# Altium footprint library HSD_connectors.PcbLib: 59 footprints (part 4 of 7)
Each footprint in its own frame and in the unit in brackets; x right, y up, seen from the top. Pads: shape width x height; smd on the part's side, far side on the other; paste and mask are expansions set on the pad; w line width, h text height; cw(c..) or ccw(c..) is an arc to the next point about the centre after c.
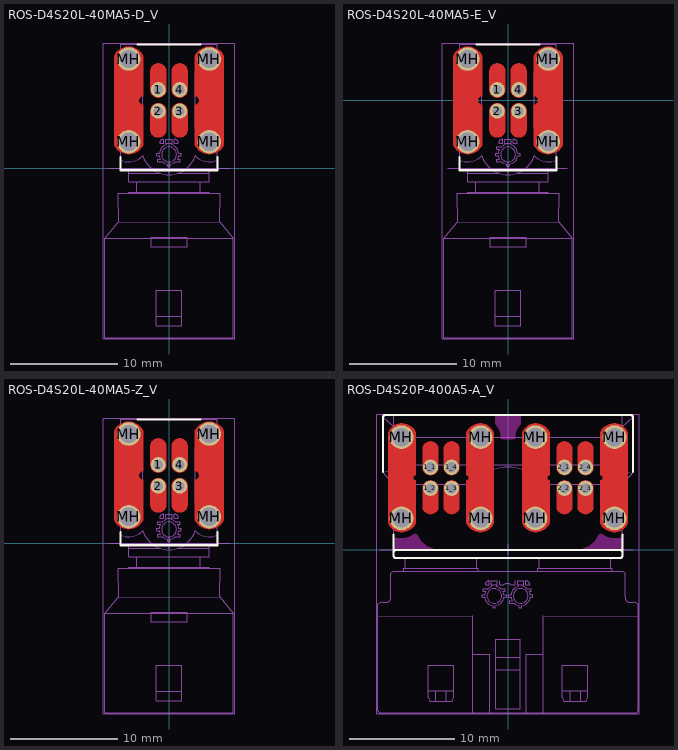
[diagram p3: the footprints below, top view; thin cyan lines are the x and y axes]

## ROS-D4S20L-40MA5-D_V [mm] "HSD Right Angle Plug, Edge Mount Pin in Paste, 27.3x12x6.95mm, Rosenberger Recommended"
height 6.95
pads (8):
  round 1.4 hole 0.9: 1(-1,7.307) 2(-1,5.307) 3(1,5.307) 4(1,7.307)
  round 2.2 hole 1.7: MH(-3.75,2.457) MH(-3.75,10.157) MH(3.75,2.457) MH(3.75,10.157)
Top Layer:
  region: 5.1,6.307 3.75,6.307 3.75,9.307 3.861,9.314 4.075,9.372 4.267,9.483 4.424,9.64 4.535,9.832 4.593,10.046 4.593,10.268 4.535,10.482 4.424,10.674 4.267,10.831 4.075,10.942 3.861,11 3.75,11.007 3.75,11.307 3.855,11.307 4.064,11.278 4.267,11.219 4.459,11.133 4.637,11.021 4.798,10.885 4.939,10.728 5.056,10.553 5.102,10.458 5.1,10.458
  region: 3.75,11.307 3.645,11.307 3.436,11.278 3.233,11.219 3.041,11.133 2.863,11.021 2.702,10.885 2.561,10.728 2.444,10.553 2.398,10.458 2.4,10.458 2.4,6.707 2.478,6.699 2.622,6.64 2.733,6.529 2.792,6.385 2.8,6.307 3.75,6.307 3.75,9.307 3.639,9.314 3.425,9.372 3.233,9.483 3.076,9.64 2.965,9.832 2.907,10.046 2.907,10.268 2.965,10.482 3.076,10.674 3.233,10.831 3.425,10.942 3.639,11 3.75,11.007
  region: -5.1,6.307 -3.75,6.307 -3.75,9.307 -3.861,9.314 -4.075,9.372 -4.267,9.483 -4.424,9.64 -4.535,9.832 -4.593,10.046 -4.593,10.268 -4.535,10.482 -4.424,10.674 -4.267,10.831 -4.075,10.942 -3.861,11 -3.75,11.007 -3.75,11.307 -3.855,11.307 -4.064,11.278 -4.267,11.219 -4.459,11.133 -4.637,11.021 -4.798,10.885 -4.939,10.728 -5.056,10.553 -5.102,10.458 -5.1,10.458
  region: -3.75,11.307 -3.645,11.307 -3.436,11.278 -3.233,11.219 -3.041,11.133 -2.863,11.021 -2.702,10.885 -2.561,10.728 -2.444,10.553 -2.398,10.458 -2.4,10.458 -2.4,6.707 -2.478,6.699 -2.622,6.64 -2.733,6.529 -2.792,6.385 -2.8,6.307 -3.75,6.307 -3.75,9.307 -3.639,9.314 -3.425,9.372 -3.233,9.483 -3.076,9.64 -2.965,9.832 -2.907,10.046 -2.907,10.268 -2.965,10.482 -3.076,10.674 -3.233,10.831 -3.425,10.942 -3.639,11 -3.75,11.007
  region: -5.1,6.307 -3.75,6.307 -3.75,3.307 -3.861,3.3 -4.075,3.242 -4.267,3.131 -4.424,2.974 -4.535,2.782 -4.593,2.568 -4.593,2.346 -4.535,2.132 -4.424,1.94 -4.267,1.783 -4.075,1.672 -3.861,1.614 -3.75,1.607 -3.75,1.307 -3.855,1.307 -4.064,1.336 -4.267,1.395 -4.459,1.481 -4.637,1.593 -4.798,1.729 -4.939,1.886 -5.056,2.061 -5.102,2.156 -5.1,2.156
  region: -3.75,1.307 -3.645,1.307 -3.436,1.336 -3.233,1.395 -3.041,1.481 -2.863,1.593 -2.702,1.729 -2.561,1.886 -2.444,2.061 -2.398,2.156 -2.4,2.156 -2.4,5.907 -2.478,5.915 -2.622,5.974 -2.733,6.085 -2.792,6.229 -2.8,6.307 -3.75,6.307 -3.75,3.307 -3.639,3.3 -3.425,3.242 -3.233,3.131 -3.076,2.974 -2.965,2.782 -2.907,2.568 -2.907,2.346 -2.965,2.132 -3.076,1.94 -3.233,1.783 -3.425,1.672 -3.639,1.614 -3.75,1.607
  region: 3.75,1.307 3.645,1.307 3.436,1.336 3.233,1.395 3.041,1.481 2.863,1.593 2.702,1.729 2.561,1.886 2.444,2.061 2.398,2.156 2.4,2.156 2.4,5.907 2.478,5.915 2.622,5.974 2.733,6.085 2.792,6.229 2.8,6.307 3.75,6.307 3.75,3.307 3.639,3.3 3.425,3.242 3.233,3.131 3.076,2.974 2.965,2.782 2.907,2.568 2.907,2.346 2.965,2.132 3.076,1.94 3.233,1.783 3.425,1.672 3.639,1.614 3.75,1.607
  region: 5.1,6.307 3.75,6.307 3.75,3.307 3.861,3.3 4.075,3.242 4.267,3.131 4.424,2.974 4.535,2.782 4.593,2.568 4.593,2.346 4.535,2.132 4.424,1.94 4.267,1.783 4.075,1.672 3.861,1.614 3.75,1.607 3.75,1.307 3.855,1.307 4.064,1.336 4.267,1.395 4.459,1.481 4.637,1.593 4.798,1.729 4.939,1.886 5.056,2.061 5.102,2.156 5.1,2.156
  region: -1.75,9.007 -1.75,9.081 -1.721,9.226 -1.665,9.362 -1.583,9.485 -1.478,9.59 -1.355,9.672 -1.219,9.728 -1.074,9.757 -1,9.757 -1,7.757 -1.088,7.748 -1.25,7.681 -1.374,7.557 -1.441,7.395 -1.441,7.219 -1.374,7.057 -1.25,6.933 -1.088,6.866 -1,6.857 -1,6.557 -1.074,6.557 -1.219,6.586 -1.355,6.642 -1.478,6.724 -1.583,6.829 -1.665,6.952 -1.721,7.088 -1.75,7.233 -1.75,7.307
  region: -0.25,9.007 -0.25,9.081 -0.279,9.226 -0.335,9.362 -0.417,9.485 -0.522,9.59 -0.645,9.672 -0.781,9.728 -0.926,9.757 -1,9.757 -1,7.757 -0.912,7.748 -0.75,7.681 -0.626,7.557 -0.559,7.395 -0.559,7.219 -0.626,7.057 -0.75,6.933 -0.912,6.866 -1,6.857 -1,6.557 -0.926,6.557 -0.781,6.586 -0.645,6.642 -0.522,6.724 -0.417,6.829 -0.335,6.952 -0.279,7.088 -0.25,7.233 -0.25,7.307
  region: -1.75,3.607 -1.75,3.533 -1.721,3.388 -1.665,3.252 -1.583,3.129 -1.478,3.024 -1.355,2.942 -1.219,2.886 -1.074,2.857 -1,2.857 -1,4.857 -1.088,4.866 -1.25,4.933 -1.374,5.057 -1.441,5.219 -1.441,5.395 -1.374,5.557 -1.25,5.681 -1.088,5.748 -1,5.757 -1,6.057 -1.074,6.057 -1.219,6.028 -1.355,5.972 -1.478,5.89 -1.583,5.785 -1.665,5.662 -1.721,5.526 -1.75,5.381 -1.75,5.307
  region: -0.25,3.607 -0.25,3.533 -0.279,3.388 -0.335,3.252 -0.417,3.129 -0.522,3.024 -0.645,2.942 -0.781,2.886 -0.926,2.857 -1,2.857 -1,4.857 -0.912,4.866 -0.75,4.933 -0.626,5.057 -0.559,5.219 -0.559,5.395 -0.626,5.557 -0.75,5.681 -0.912,5.748 -1,5.757 -1,6.057 -0.926,6.057 -0.781,6.028 -0.645,5.972 -0.522,5.89 -0.417,5.785 -0.335,5.662 -0.279,5.526 -0.25,5.381 -0.25,5.307
  region: 1.75,3.607 1.75,3.533 1.721,3.388 1.665,3.252 1.583,3.129 1.478,3.024 1.355,2.942 1.219,2.886 1.074,2.857 1,2.857 1,4.857 1.088,4.866 1.25,4.933 1.374,5.057 1.441,5.219 1.441,5.395 1.374,5.557 1.25,5.681 1.088,5.748 1,5.757 1,6.057 1.074,6.057 1.219,6.028 1.355,5.972 1.478,5.89 1.583,5.785 1.665,5.662 1.721,5.526 1.75,5.381 1.75,5.307
  region: 0.25,3.607 0.25,3.533 0.279,3.388 0.335,3.252 0.417,3.129 0.522,3.024 0.645,2.942 0.781,2.886 0.926,2.857 1,2.857 1,4.857 0.912,4.866 0.75,4.933 0.626,5.057 0.559,5.219 0.559,5.395 0.626,5.557 0.75,5.681 0.912,5.748 1,5.757 1,6.057 0.926,6.057 0.781,6.028 0.645,5.972 0.522,5.89 0.417,5.785 0.335,5.662 0.279,5.526 0.25,5.381 0.25,5.307
  region: 0.25,9.007 0.25,9.081 0.279,9.226 0.335,9.362 0.417,9.485 0.522,9.59 0.645,9.672 0.781,9.728 0.926,9.757 1,9.757 1,7.757 0.912,7.748 0.75,7.681 0.626,7.557 0.559,7.395 0.559,7.219 0.626,7.057 0.75,6.933 0.912,6.866 1,6.857 1,6.557 0.926,6.557 0.781,6.586 0.645,6.642 0.522,6.724 0.417,6.829 0.335,6.952 0.279,7.088 0.25,7.233 0.25,7.307
  region: 1.75,9.007 1.75,9.081 1.721,9.226 1.665,9.362 1.583,9.485 1.478,9.59 1.355,9.672 1.219,9.728 1.074,9.757 1,9.757 1,7.757 1.088,7.748 1.25,7.681 1.374,7.557 1.441,7.395 1.441,7.219 1.374,7.057 1.25,6.933 1.088,6.866 1,6.857 1,6.557 1.074,6.557 1.219,6.586 1.355,6.642 1.478,6.724 1.583,6.829 1.665,6.952 1.721,7.088 1.75,7.233 1.75,7.307
Top Overlay:
  lines w0.2: -4.5,1.054 -4.5,-0.191 ; -2.903,11.509 2.903,11.509 ; 4.5,1.054 4.5,-0.191 3.725,-0.191 -3.725,-0.191 -4.5,-0.191 ; -4.5,-0.191 -4.5,-0.191
Top Paste:
  drawing of 8 lines, arcs and shapes, not listed
Top Solder:
  drawing of 8 lines, arcs and shapes, not listed
Mechanical 3:
  lines w0.1: -5.6,0 5.7,0
  text "Board Edge" at -5.6,-0.6 h0.2
Mechanical 13:
  circle w0.1: c3.75,2.457 r0.675
  circle w0.1: c-3.75,2.457 r0.675
  circle w0.1: c-3.75,10.157 r0.675
  circle w0.1: c3.75,10.157 r0.675
  circle w0.1: c1,5.307 r0.34
  circle w0.1: c1,7.307 r0.34
  circle w0.1: c-1,7.307 r0.34
  circle w0.1: c-1,5.307 r0.34
  circle w0.1: c0,1.282 r0.7
  lines w0.1: -4.493,0.748 ccw(c-3.75,2.457) -2.42,1.152 ; -4.493,4.166 cw(c-3.75,2.457) -2.42,3.762 -2.42,8.852 cw(c-3.75,10.157) -4.493,8.448 ; -3.725,-2.341 -3.725,-2.241 3.725,-2.241 3.725,-2.341 ; -3.725,-0.491 -0.785,-0.491 ; -3,-2.241 -3,-1.241 ; -2.425,1.151 ccw(c0,1.932) 2.425,1.151 ; -1.7,-7.291 1.7,-7.291 1.7,-6.441 -1.7,-6.441 -1.693,-7.291 ; -1.2,-13.791 1.2,-13.791 ; -0.915,1.169 -1.121,1.169 -1.121,1.395 -0.915,1.395 cw(c0,1.282) -0.251,2.169 ; -0.915,1.169 ccw(c0,1.282) -0.798,0.819 ; -0.798,0.818 -1.025,0.818 -1.025,0.582 -0.6,0.582 ; -0.6,0.582 ccw(c0,1.282) -0.113,0.367 -0.113,0.161 0.113,0.161 0.113,0.367 ccw(c0,1.282) 0.6,0.582 ; -0.215,2.332 0.285,2.332 ; 0.25,2.166 0.25,2.332 -0.25,2.332 ; 0.251,2.169 cw(c0,1.282) 0.915,1.395 1.121,1.395 1.121,1.169 0.915,1.169 ; 0.6,0.582 1.025,0.582 1.025,0.818 0.798,0.818 ; 0.785,-0.491 3.725,-0.491 ; 0.798,0.819 ccw(c0,1.282) 0.915,1.169 ; 2.42,1.152 ccw(c3.75,2.457) 4.493,0.748 ; 2.898,-2.241 2.898,-1.241 ; 4.493,4.166 ccw(c3.75,2.457) 2.42,3.762 2.42,8.852 ccw(c3.75,10.157) 4.493,8.448 ; 4.747,-4.996 -4.717,-5.011 ; 5.842,-15.791 5.969,-15.791 ; 5.983,-6.518 4.742,-4.99 4.75,-2.341 -4.75,-2.341 -4.717,-5.011 ; -5.983,-6.518 -4.717,-5.011 ; -5.983,-6.518 -6,-15.791 6,-15.791 6,-6.518 -5.983,-6.518 ; -3.725,-0.191 -4.5,-0.191 -4.5,11.509 4.5,11.509 4.5,-0.191 3.725,-0.191 ; -3.725,-0.191 -3.725,-1.241 -3,-1.241 ; -3.725,-0.191 3.725,-0.191 ; -3,-1.241 2.898,-1.241 ; -0.25,2.332 -0.25,2.166 -0.25,2.332 ; 0.285,2.332 0.285,2.707 -0.285,2.707 -0.285,2.332 0.285,2.332 ; 2.898,-1.241 3.725,-1.241 3.725,-0.191 ; -1.2,-14.655 1.2,-14.638 1.2,-11.341 -1.2,-11.341 -1.2,-14.655 ; -0.875,2.332 cw(c-0.5,2.332) -0.5,2.707 -0.5,2.332 -0.875,2.332 ; 0.5,2.332 0.5,2.707 cw(c0.5,2.332) 0.875,2.332 0.5,2.332
  text ".Designator" at -3.798,-4.402 h2.69
Mechanical 15:
  lines w0.05: -6.1,-15.891 6.1,-15.892 6.1,11.609 -6.1,11.609 -6.1,-15.891
  lines w0.1: -0.5,0 0.5,0 ; 0,-0.5 0,0.5
3D body "d4s20l-40mA5-D.stp": height 10.95, standoff -3.2, extent -6,-15.791 6,11.509

## ROS-D4S20L-40MA5-E_V [mm] "HSD Right Angle Plug, Edge Mount Pin in Paste, 27.3x12x6.95mm, Rosenberger Recommended"
height 6.95
pads (8):
  round 1.4 hole 0.9: 1(-1,1) 2(-1,-1) 3(1,-1) 4(1,1)
  round 2.2 hole 1.7: MH(-3.75,-3.85) MH(-3.75,3.85) MH(3.75,-3.85) MH(3.75,3.85)
Top Layer:
  region: 1.75,2.7 1.75,2.774 1.721,2.919 1.665,3.055 1.583,3.178 1.478,3.283 1.355,3.365 1.219,3.421 1.074,3.45 1,3.45 1,1.45 1.088,1.441 1.25,1.374 1.374,1.25 1.441,1.088 1.441,0.912 1.374,0.75 1.25,0.626 1.088,0.559 1,0.55 1,0.25 1.074,0.25 1.219,0.279 1.355,0.335 1.478,0.417 1.583,0.522 1.665,0.645 1.721,0.781 1.75,0.926 1.75,1
  region: 0.25,2.7 0.25,2.774 0.279,2.919 0.335,3.055 0.417,3.178 0.522,3.283 0.645,3.365 0.781,3.421 0.926,3.45 1,3.45 1,1.45 0.912,1.441 0.75,1.374 0.626,1.25 0.559,1.088 0.559,0.912 0.626,0.75 0.75,0.626 0.912,0.559 1,0.55 1,0.25 0.926,0.25 0.781,0.279 0.645,0.335 0.522,0.417 0.417,0.522 0.335,0.645 0.279,0.781 0.25,0.926 0.25,1
  region: 0.25,-2.7 0.25,-2.774 0.279,-2.919 0.335,-3.055 0.417,-3.178 0.522,-3.283 0.645,-3.365 0.781,-3.421 0.926,-3.45 1,-3.45 1,-1.45 0.912,-1.441 0.75,-1.374 0.626,-1.25 0.559,-1.088 0.559,-0.912 0.626,-0.75 0.75,-0.626 0.912,-0.559 1,-0.55 1,-0.25 0.926,-0.25 0.781,-0.279 0.645,-0.335 0.522,-0.417 0.417,-0.522 0.335,-0.645 0.279,-0.781 0.25,-0.926 0.25,-1
  region: 1.75,-2.7 1.75,-2.774 1.721,-2.919 1.665,-3.055 1.583,-3.178 1.478,-3.283 1.355,-3.365 1.219,-3.421 1.074,-3.45 1,-3.45 1,-1.45 1.088,-1.441 1.25,-1.374 1.374,-1.25 1.441,-1.088 1.441,-0.912 1.374,-0.75 1.25,-0.626 1.088,-0.559 1,-0.55 1,-0.25 1.074,-0.25 1.219,-0.279 1.355,-0.335 1.478,-0.417 1.583,-0.522 1.665,-0.645 1.721,-0.781 1.75,-0.926 1.75,-1
  region: -0.25,-2.7 -0.25,-2.774 -0.279,-2.919 -0.335,-3.055 -0.417,-3.178 -0.522,-3.283 -0.645,-3.365 -0.781,-3.421 -0.926,-3.45 -1,-3.45 -1,-1.45 -0.912,-1.441 -0.75,-1.374 -0.626,-1.25 -0.559,-1.088 -0.559,-0.912 -0.626,-0.75 -0.75,-0.626 -0.912,-0.559 -1,-0.55 -1,-0.25 -0.926,-0.25 -0.781,-0.279 -0.645,-0.335 -0.522,-0.417 -0.417,-0.522 -0.335,-0.645 -0.279,-0.781 -0.25,-0.926 -0.25,-1
  region: -1.75,-2.7 -1.75,-2.774 -1.721,-2.919 -1.665,-3.055 -1.583,-3.178 -1.478,-3.283 -1.355,-3.365 -1.219,-3.421 -1.074,-3.45 -1,-3.45 -1,-1.45 -1.088,-1.441 -1.25,-1.374 -1.374,-1.25 -1.441,-1.088 -1.441,-0.912 -1.374,-0.75 -1.25,-0.626 -1.088,-0.559 -1,-0.55 -1,-0.25 -1.074,-0.25 -1.219,-0.279 -1.355,-0.335 -1.478,-0.417 -1.583,-0.522 -1.665,-0.645 -1.721,-0.781 -1.75,-0.926 -1.75,-1
  region: -0.25,2.7 -0.25,2.774 -0.279,2.919 -0.335,3.055 -0.417,3.178 -0.522,3.283 -0.645,3.365 -0.781,3.421 -0.926,3.45 -1,3.45 -1,1.45 -0.912,1.441 -0.75,1.374 -0.626,1.25 -0.559,1.088 -0.559,0.912 -0.626,0.75 -0.75,0.626 -0.912,0.559 -1,0.55 -1,0.25 -0.926,0.25 -0.781,0.279 -0.645,0.335 -0.522,0.417 -0.417,0.522 -0.335,0.645 -0.279,0.781 -0.25,0.926 -0.25,1
  region: -1.75,2.7 -1.75,2.774 -1.721,2.919 -1.665,3.055 -1.583,3.178 -1.478,3.283 -1.355,3.365 -1.219,3.421 -1.074,3.45 -1,3.45 -1,1.45 -1.088,1.441 -1.25,1.374 -1.374,1.25 -1.441,1.088 -1.441,0.912 -1.374,0.75 -1.25,0.626 -1.088,0.559 -1,0.55 -1,0.25 -1.074,0.25 -1.219,0.279 -1.355,0.335 -1.478,0.417 -1.583,0.522 -1.665,0.645 -1.721,0.781 -1.75,0.926 -1.75,1
  region: 5.1,0 3.75,0 3.75,-3 3.861,-3.007 4.075,-3.065 4.267,-3.176 4.424,-3.333 4.535,-3.525 4.593,-3.739 4.593,-3.961 4.535,-4.175 4.424,-4.367 4.267,-4.524 4.075,-4.635 3.861,-4.693 3.75,-4.7 3.75,-5 3.855,-5 4.064,-4.971 4.267,-4.912 4.459,-4.826 4.637,-4.714 4.798,-4.578 4.939,-4.421 5.056,-4.246 5.102,-4.151 5.1,-4.151
  region: 3.75,-5 3.645,-5 3.436,-4.971 3.233,-4.912 3.041,-4.826 2.863,-4.714 2.702,-4.578 2.561,-4.421 2.444,-4.246 2.398,-4.151 2.4,-4.151 2.4,-0.4 2.478,-0.392 2.622,-0.333 2.733,-0.222 2.792,-0.078 2.8,0 3.75,0 3.75,-3 3.639,-3.007 3.425,-3.065 3.233,-3.176 3.076,-3.333 2.965,-3.525 2.907,-3.739 2.907,-3.961 2.965,-4.175 3.076,-4.367 3.233,-4.524 3.425,-4.635 3.639,-4.693 3.75,-4.7
  region: -3.75,-5 -3.645,-5 -3.436,-4.971 -3.233,-4.912 -3.041,-4.826 -2.863,-4.714 -2.702,-4.578 -2.561,-4.421 -2.444,-4.246 -2.398,-4.151 -2.4,-4.151 -2.4,-0.4 -2.478,-0.392 -2.622,-0.333 -2.733,-0.222 -2.792,-0.078 -2.8,0 -3.75,0 -3.75,-3 -3.639,-3.007 -3.425,-3.065 -3.233,-3.176 -3.076,-3.333 -2.965,-3.525 -2.907,-3.739 -2.907,-3.961 -2.965,-4.175 -3.076,-4.367 -3.233,-4.524 -3.425,-4.635 -3.639,-4.693 -3.75,-4.7
  region: -5.1,0 -3.75,0 -3.75,-3 -3.861,-3.007 -4.075,-3.065 -4.267,-3.176 -4.424,-3.333 -4.535,-3.525 -4.593,-3.739 -4.593,-3.961 -4.535,-4.175 -4.424,-4.367 -4.267,-4.524 -4.075,-4.635 -3.861,-4.693 -3.75,-4.7 -3.75,-5 -3.855,-5 -4.064,-4.971 -4.267,-4.912 -4.459,-4.826 -4.637,-4.714 -4.798,-4.578 -4.939,-4.421 -5.056,-4.246 -5.102,-4.151 -5.1,-4.151
  region: -3.75,5 -3.645,5 -3.436,4.971 -3.233,4.912 -3.041,4.826 -2.863,4.714 -2.702,4.578 -2.561,4.421 -2.444,4.246 -2.398,4.151 -2.4,4.151 -2.4,0.4 -2.478,0.392 -2.622,0.333 -2.733,0.222 -2.792,0.078 -2.8,0 -3.75,0 -3.75,3 -3.639,3.007 -3.425,3.065 -3.233,3.176 -3.076,3.333 -2.965,3.525 -2.907,3.739 -2.907,3.961 -2.965,4.175 -3.076,4.367 -3.233,4.524 -3.425,4.635 -3.639,4.693 -3.75,4.7
  region: -5.1,0 -3.75,0 -3.75,3 -3.861,3.007 -4.075,3.065 -4.267,3.176 -4.424,3.333 -4.535,3.525 -4.593,3.739 -4.593,3.961 -4.535,4.175 -4.424,4.367 -4.267,4.524 -4.075,4.635 -3.861,4.693 -3.75,4.7 -3.75,5 -3.855,5 -4.064,4.971 -4.267,4.912 -4.459,4.826 -4.637,4.714 -4.798,4.578 -4.939,4.421 -5.056,4.246 -5.102,4.151 -5.1,4.151
  region: 3.75,5 3.645,5 3.436,4.971 3.233,4.912 3.041,4.826 2.863,4.714 2.702,4.578 2.561,4.421 2.444,4.246 2.398,4.151 2.4,4.151 2.4,0.4 2.478,0.392 2.622,0.333 2.733,0.222 2.792,0.078 2.8,0 3.75,0 3.75,3 3.639,3.007 3.425,3.065 3.233,3.176 3.076,3.333 2.965,3.525 2.907,3.739 2.907,3.961 2.965,4.175 3.076,4.367 3.233,4.524 3.425,4.635 3.639,4.693 3.75,4.7
  region: 5.1,0 3.75,0 3.75,3 3.861,3.007 4.075,3.065 4.267,3.176 4.424,3.333 4.535,3.525 4.593,3.739 4.593,3.961 4.535,4.175 4.424,4.367 4.267,4.524 4.075,4.635 3.861,4.693 3.75,4.7 3.75,5 3.855,5 4.064,4.971 4.267,4.912 4.459,4.826 4.637,4.714 4.798,4.578 4.939,4.421 5.056,4.246 5.102,4.151 5.1,4.151
Top Overlay:
  lines w0.2: -4.5,-5.253 -4.5,-6.498 ; -2.903,5.202 2.903,5.202 ; 4.5,-5.253 4.5,-6.498 3.725,-6.498 -3.725,-6.498 -4.5,-6.498 ; -4.5,-6.498 -4.5,-6.498
Top Paste:
  drawing of 8 lines, arcs and shapes, not listed
Top Solder:
  drawing of 8 lines, arcs and shapes, not listed
Mechanical 3:
  lines w0.1: -5.6,-6.3 5.5,-6.3
  text "Board Edge" at -5.3,-7 h0.2
Mechanical 13:
  circle w0.1: c0,-5.025 r0.7
  circle w0.1: c-1,-1 r0.34
  circle w0.1: c-1,1 r0.34
  circle w0.1: c1,1 r0.34
  circle w0.1: c1,-1 r0.34
  circle w0.1: c3.75,3.85 r0.675
  circle w0.1: c-3.75,3.85 r0.675
  circle w0.1: c-3.75,-3.85 r0.675
  circle w0.1: c3.75,-3.85 r0.675
  lines w0.1: -4.493,-5.559 ccw(c-3.75,-3.85) -2.42,-5.155 ; -4.493,-2.141 cw(c-3.75,-3.85) -2.42,-2.545 -2.42,2.545 cw(c-3.75,3.85) -4.493,2.141 ; -3.725,-8.648 -3.725,-8.548 3.725,-8.548 3.725,-8.648 ; -3.725,-6.798 -0.785,-6.798 ; -3,-8.548 -3,-7.548 ; -2.425,-5.156 ccw(c0,-4.375) 2.425,-5.156 ; -1.7,-13.598 1.7,-13.598 1.7,-12.748 -1.7,-12.748 -1.693,-13.598 ; -1.2,-20.098 1.2,-20.098 ; -0.915,-5.138 -1.121,-5.138 -1.121,-4.912 -0.915,-4.912 cw(c0,-5.025) -0.798,-4.562 ; -0.915,-5.138 ccw(c0,-5.025) -0.798,-5.488 ; -0.798,-5.489 -1.025,-5.489 -1.025,-5.725 -0.6,-5.725 ; -0.798,-4.561 -1.025,-4.561 -1.025,-4.325 -0.6,-4.325 ; -0.6,-5.725 ccw(c0,-5.025) -0.113,-5.94 -0.113,-6.146 0.113,-6.146 0.113,-5.94 ccw(c0,-5.025) 0.915,-5.138 ; -0.6,-4.325 cw(c0,-5.025) -0.261,-4.141 ; -0.215,-3.975 0.285,-3.975 ; 0.25,-4.141 0.25,-3.975 -0.25,-3.975 ; 0.251,-4.138 cw(c0,-5.025) 0.915,-4.912 1.121,-4.912 1.121,-5.138 0.915,-5.138 ; 0.785,-6.798 3.725,-6.798 ; 2.42,-5.155 ccw(c3.75,-3.85) 4.493,-5.559 ; 2.898,-8.548 2.898,-7.548 ; 4.493,-2.141 ccw(c3.75,-3.85) 2.42,-2.545 2.42,2.545 ccw(c3.75,3.85) 4.493,2.141 ; 4.747,-11.303 -4.717,-11.318 ; 5.842,-22.098 5.969,-22.098 ; 5.983,-12.825 4.742,-11.297 4.75,-8.648 -4.75,-8.648 -4.717,-11.318 ; -5.983,-12.825 6,-12.825 6,-22.098 -6,-22.098 -5.983,-12.825 ; -5.983,-12.825 -4.717,-11.318 ; -3.725,-6.498 3.725,-6.498 ; -3.725,-6.498 -3.725,-7.548 -3,-7.548 ; -3.725,-6.498 -4.5,-6.498 -4.5,5.202 4.5,5.202 4.5,-6.498 3.725,-6.498 ; -3,-7.548 2.898,-7.548 ; -0.25,-3.975 -0.25,-4.141 -0.25,-3.975 ; 0.285,-3.975 -0.285,-3.975 -0.285,-3.6 0.285,-3.6 0.285,-3.975 ; 2.898,-7.548 3.725,-7.548 3.725,-6.498 ; -1.2,-20.962 -1.2,-17.648 1.2,-17.648 1.2,-20.945 -1.2,-20.962 ; -0.875,-3.975 cw(c-0.5,-3.975) -0.5,-3.6 -0.5,-3.975 -0.875,-3.975 ; 0.5,-3.975 0.875,-3.975 ccw(c0.5,-3.975) 0.5,-3.6 0.5,-3.975
  text ".Designator" at -3.29,-10.752 h2.69
Mechanical 15:
  lines w0.05: -6.1,-22.198 6.1,-22.199 6.1,5.302 -6.1,5.302 -6.1,-22.198
  lines w0.1: -0.5,-6.307 0.5,-6.307 ; 0,-6.807 0,-5.807
3D body "d4s20l-40mA5-E.stp": height 10.95, standoff -3.2, extent -6,-22.098 6,5.202

## ROS-D4S20L-40MA5-Z_V [mm] "HSD Right Angle Plug, Edge Mount Pin in Paste, 27.3x12x6.95mm, Rosenberger Recommended"
height 6.95
pads (8):
  round 1.4 hole 0.9: 1(-1,7.307) 2(-1,5.307) 3(1,5.307) 4(1,7.307)
  round 2.2 hole 1.7: MH(-3.75,2.457) MH(-3.75,10.157) MH(3.75,2.457) MH(3.75,10.157)
Top Layer:
  region: 1.75,9.007 1.75,9.081 1.721,9.226 1.665,9.362 1.583,9.485 1.478,9.59 1.355,9.672 1.219,9.728 1.074,9.757 1,9.757 1,7.757 1.088,7.748 1.25,7.681 1.374,7.557 1.441,7.395 1.441,7.219 1.374,7.057 1.25,6.933 1.088,6.866 1,6.857 1,6.557 1.074,6.557 1.219,6.586 1.355,6.642 1.478,6.724 1.583,6.829 1.665,6.952 1.721,7.088 1.75,7.233 1.75,7.307
  region: 0.25,9.007 0.25,9.081 0.279,9.226 0.335,9.362 0.417,9.485 0.522,9.59 0.645,9.672 0.781,9.728 0.926,9.757 1,9.757 1,7.757 0.912,7.748 0.75,7.681 0.626,7.557 0.559,7.395 0.559,7.219 0.626,7.057 0.75,6.933 0.912,6.866 1,6.857 1,6.557 0.926,6.557 0.781,6.586 0.645,6.642 0.522,6.724 0.417,6.829 0.335,6.952 0.279,7.088 0.25,7.233 0.25,7.307
  region: 0.25,3.607 0.25,3.533 0.279,3.388 0.335,3.252 0.417,3.129 0.522,3.024 0.645,2.942 0.781,2.886 0.926,2.857 1,2.857 1,4.857 0.912,4.866 0.75,4.933 0.626,5.057 0.559,5.219 0.559,5.395 0.626,5.557 0.75,5.681 0.912,5.748 1,5.757 1,6.057 0.926,6.057 0.781,6.028 0.645,5.972 0.522,5.89 0.417,5.785 0.335,5.662 0.279,5.526 0.25,5.381 0.25,5.307
  region: 1.75,3.607 1.75,3.533 1.721,3.388 1.665,3.252 1.583,3.129 1.478,3.024 1.355,2.942 1.219,2.886 1.074,2.857 1,2.857 1,4.857 1.088,4.866 1.25,4.933 1.374,5.057 1.441,5.219 1.441,5.395 1.374,5.557 1.25,5.681 1.088,5.748 1,5.757 1,6.057 1.074,6.057 1.219,6.028 1.355,5.972 1.478,5.89 1.583,5.785 1.665,5.662 1.721,5.526 1.75,5.381 1.75,5.307
  region: -0.25,3.607 -0.25,3.533 -0.279,3.388 -0.335,3.252 -0.417,3.129 -0.522,3.024 -0.645,2.942 -0.781,2.886 -0.926,2.857 -1,2.857 -1,4.857 -0.912,4.866 -0.75,4.933 -0.626,5.057 -0.559,5.219 -0.559,5.395 -0.626,5.557 -0.75,5.681 -0.912,5.748 -1,5.757 -1,6.057 -0.926,6.057 -0.781,6.028 -0.645,5.972 -0.522,5.89 -0.417,5.785 -0.335,5.662 -0.279,5.526 -0.25,5.381 -0.25,5.307
  region: -1.75,3.607 -1.75,3.533 -1.721,3.388 -1.665,3.252 -1.583,3.129 -1.478,3.024 -1.355,2.942 -1.219,2.886 -1.074,2.857 -1,2.857 -1,4.857 -1.088,4.866 -1.25,4.933 -1.374,5.057 -1.441,5.219 -1.441,5.395 -1.374,5.557 -1.25,5.681 -1.088,5.748 -1,5.757 -1,6.057 -1.074,6.057 -1.219,6.028 -1.355,5.972 -1.478,5.89 -1.583,5.785 -1.665,5.662 -1.721,5.526 -1.75,5.381 -1.75,5.307
  region: -0.25,9.007 -0.25,9.081 -0.279,9.226 -0.335,9.362 -0.417,9.485 -0.522,9.59 -0.645,9.672 -0.781,9.728 -0.926,9.757 -1,9.757 -1,7.757 -0.912,7.748 -0.75,7.681 -0.626,7.557 -0.559,7.395 -0.559,7.219 -0.626,7.057 -0.75,6.933 -0.912,6.866 -1,6.857 -1,6.557 -0.926,6.557 -0.781,6.586 -0.645,6.642 -0.522,6.724 -0.417,6.829 -0.335,6.952 -0.279,7.088 -0.25,7.233 -0.25,7.307
  region: -1.75,9.007 -1.75,9.081 -1.721,9.226 -1.665,9.362 -1.583,9.485 -1.478,9.59 -1.355,9.672 -1.219,9.728 -1.074,9.757 -1,9.757 -1,7.757 -1.088,7.748 -1.25,7.681 -1.374,7.557 -1.441,7.395 -1.441,7.219 -1.374,7.057 -1.25,6.933 -1.088,6.866 -1,6.857 -1,6.557 -1.074,6.557 -1.219,6.586 -1.355,6.642 -1.478,6.724 -1.583,6.829 -1.665,6.952 -1.721,7.088 -1.75,7.233 -1.75,7.307
  region: 5.1,6.307 3.75,6.307 3.75,3.307 3.861,3.3 4.075,3.242 4.267,3.131 4.424,2.974 4.535,2.782 4.593,2.568 4.593,2.346 4.535,2.132 4.424,1.94 4.267,1.783 4.075,1.672 3.861,1.614 3.75,1.607 3.75,1.307 3.855,1.307 4.064,1.336 4.267,1.395 4.459,1.481 4.637,1.593 4.798,1.729 4.939,1.886 5.056,2.061 5.102,2.156 5.1,2.156
  region: 3.75,1.307 3.645,1.307 3.436,1.336 3.233,1.395 3.041,1.481 2.863,1.593 2.702,1.729 2.561,1.886 2.444,2.061 2.398,2.156 2.4,2.156 2.4,5.907 2.478,5.915 2.622,5.974 2.733,6.085 2.792,6.229 2.8,6.307 3.75,6.307 3.75,3.307 3.639,3.3 3.425,3.242 3.233,3.131 3.076,2.974 2.965,2.782 2.907,2.568 2.907,2.346 2.965,2.132 3.076,1.94 3.233,1.783 3.425,1.672 3.639,1.614 3.75,1.607
  region: -3.75,1.307 -3.645,1.307 -3.436,1.336 -3.233,1.395 -3.041,1.481 -2.863,1.593 -2.702,1.729 -2.561,1.886 -2.444,2.061 -2.398,2.156 -2.4,2.156 -2.4,5.907 -2.478,5.915 -2.622,5.974 -2.733,6.085 -2.792,6.229 -2.8,6.307 -3.75,6.307 -3.75,3.307 -3.639,3.3 -3.425,3.242 -3.233,3.131 -3.076,2.974 -2.965,2.782 -2.907,2.568 -2.907,2.346 -2.965,2.132 -3.076,1.94 -3.233,1.783 -3.425,1.672 -3.639,1.614 -3.75,1.607
  region: -5.1,6.307 -3.75,6.307 -3.75,3.307 -3.861,3.3 -4.075,3.242 -4.267,3.131 -4.424,2.974 -4.535,2.782 -4.593,2.568 -4.593,2.346 -4.535,2.132 -4.424,1.94 -4.267,1.783 -4.075,1.672 -3.861,1.614 -3.75,1.607 -3.75,1.307 -3.855,1.307 -4.064,1.336 -4.267,1.395 -4.459,1.481 -4.637,1.593 -4.798,1.729 -4.939,1.886 -5.056,2.061 -5.102,2.156 -5.1,2.156
  region: -3.75,11.307 -3.645,11.307 -3.436,11.278 -3.233,11.219 -3.041,11.133 -2.863,11.021 -2.702,10.885 -2.561,10.728 -2.444,10.553 -2.398,10.458 -2.4,10.458 -2.4,6.707 -2.478,6.699 -2.622,6.64 -2.733,6.529 -2.792,6.385 -2.8,6.307 -3.75,6.307 -3.75,9.307 -3.639,9.314 -3.425,9.372 -3.233,9.483 -3.076,9.64 -2.965,9.832 -2.907,10.046 -2.907,10.268 -2.965,10.482 -3.076,10.674 -3.233,10.831 -3.425,10.942 -3.639,11 -3.75,11.007
  region: -5.1,6.307 -3.75,6.307 -3.75,9.307 -3.861,9.314 -4.075,9.372 -4.267,9.483 -4.424,9.64 -4.535,9.832 -4.593,10.046 -4.593,10.268 -4.535,10.482 -4.424,10.674 -4.267,10.831 -4.075,10.942 -3.861,11 -3.75,11.007 -3.75,11.307 -3.855,11.307 -4.064,11.278 -4.267,11.219 -4.459,11.133 -4.637,11.021 -4.798,10.885 -4.939,10.728 -5.056,10.553 -5.102,10.458 -5.1,10.458
  region: 3.75,11.307 3.645,11.307 3.436,11.278 3.233,11.219 3.041,11.133 2.863,11.021 2.702,10.885 2.561,10.728 2.444,10.553 2.398,10.458 2.4,10.458 2.4,6.707 2.478,6.699 2.622,6.64 2.733,6.529 2.792,6.385 2.8,6.307 3.75,6.307 3.75,9.307 3.639,9.314 3.425,9.372 3.233,9.483 3.076,9.64 2.965,9.832 2.907,10.046 2.907,10.268 2.965,10.482 3.076,10.674 3.233,10.831 3.425,10.942 3.639,11 3.75,11.007
  region: 5.1,6.307 3.75,6.307 3.75,9.307 3.861,9.314 4.075,9.372 4.267,9.483 4.424,9.64 4.535,9.832 4.593,10.046 4.593,10.268 4.535,10.482 4.424,10.674 4.267,10.831 4.075,10.942 3.861,11 3.75,11.007 3.75,11.307 3.855,11.307 4.064,11.278 4.267,11.219 4.459,11.133 4.637,11.021 4.798,10.885 4.939,10.728 5.056,10.553 5.102,10.458 5.1,10.458
Top Overlay:
  lines w0.2: -4.5,1.054 -4.5,-0.191 ; -2.903,11.509 2.903,11.509 ; 4.5,1.054 4.5,-0.191 3.725,-0.191 -3.725,-0.191 -4.5,-0.191 ; -4.5,-0.191 -4.5,-0.191
Top Paste:
  drawing of 8 lines, arcs and shapes, not listed
Top Solder:
  drawing of 8 lines, arcs and shapes, not listed
Mechanical 3:
  lines w0.1: -5.6,0 5.7,0
  text "Board Edge" at -5.2,-0.5 h0.2
Mechanical 13:
  circle w0.1: c0,1.282 r0.7
  circle w0.1: c-1,5.307 r0.34
  circle w0.1: c-1,7.307 r0.34
  circle w0.1: c1,7.307 r0.34
  circle w0.1: c1,5.307 r0.34
  circle w0.1: c3.75,10.157 r0.675
  circle w0.1: c-3.75,10.157 r0.675
  circle w0.1: c-3.75,2.457 r0.675
  circle w0.1: c3.75,2.457 r0.675
  lines w0.1: -4.493,0.748 ccw(c-3.75,2.457) -2.42,1.152 ; -4.493,4.166 cw(c-3.75,2.457) -2.42,3.762 -2.42,8.852 cw(c-3.75,10.157) -4.493,8.448 ; -3.725,-2.341 -3.725,-2.241 3.725,-2.241 3.725,-2.341 ; -3.725,-0.491 -0.785,-0.491 ; -3,-2.241 -3,-1.241 ; -2.425,1.151 ccw(c0,1.932) 2.425,1.151 ; -1.7,-7.291 1.7,-7.291 1.7,-6.441 -1.7,-6.441 -1.693,-7.291 ; -1.2,-13.791 1.2,-13.791 ; -0.915,1.169 -1.121,1.169 -1.121,1.395 -0.915,1.395 cw(c0,1.282) -0.798,1.745 ; -0.915,1.169 ccw(c0,1.282) -0.798,0.819 ; -0.798,0.818 -1.025,0.818 -1.025,0.582 -0.6,0.582 ; -0.798,1.746 -1.025,1.746 -1.025,1.982 -0.6,1.982 ; -0.6,0.582 ccw(c0,1.282) -0.113,0.367 -0.113,0.161 0.113,0.161 0.113,0.367 ccw(c0,1.282) 0.6,0.582 ; -0.6,1.982 cw(c0,1.282) -0.261,2.166 ; -0.215,2.332 0.285,2.332 ; 0.25,2.166 0.25,2.332 -0.25,2.332 ; 0.261,2.166 cw(c0,1.282) 0.6,1.982 ; 0.6,0.582 1.025,0.582 1.025,0.818 0.798,0.818 ; 0.6,1.982 1.025,1.982 1.025,1.746 0.798,1.746 ; 0.785,-0.491 3.725,-0.491 ; 0.798,0.819 ccw(c0,1.282) 0.915,1.169 ; 0.798,1.745 cw(c0,1.282) 0.915,1.395 1.121,1.395 1.121,1.169 0.915,1.169 ; 2.42,1.152 ccw(c3.75,2.457) 4.493,0.748 ; 2.898,-2.241 2.898,-1.241 ; 4.493,4.166 ccw(c3.75,2.457) 2.42,3.762 2.42,8.852 ccw(c3.75,10.157) 4.493,8.448 ; 4.747,-4.996 -4.717,-5.011 ; 5.842,-15.791 5.969,-15.791 ; 5.983,-6.518 4.742,-4.99 4.75,-2.341 -4.75,-2.341 -4.717,-5.011 ; -5.983,-6.518 6,-6.518 6,-15.791 -6,-15.791 -5.983,-6.518 ; -5.983,-6.518 -4.717,-5.011 ; -3.725,-0.191 3.725,-0.191 ; -3.725,-0.191 -3.725,-1.241 -3,-1.241 ; -3.725,-0.191 -4.5,-0.191 -4.5,11.509 4.5,11.509 4.5,-0.191 3.725,-0.191 ; -3,-1.241 2.898,-1.241 ; -0.25,2.332 -0.25,2.166 -0.25,2.332 ; 0.285,2.332 -0.285,2.332 -0.285,2.707 0.285,2.707 0.285,2.332 ; 2.898,-1.241 3.725,-1.241 3.725,-0.191 ; -1.2,-14.655 -1.2,-11.341 1.2,-11.341 1.2,-14.638 -1.2,-14.655 ; -0.875,2.332 cw(c-0.5,2.332) -0.5,2.707 -0.5,2.332 -0.875,2.332 ; 0.5,2.332 0.875,2.332 ccw(c0.5,2.332) 0.5,2.707 0.5,2.332
  text ".Designator" at -3.798,-4.402 h2.69
Mechanical 15:
  lines w0.05: -6.1,-15.891 -6.1,11.609 6.1,11.609 6.1,-15.891 -6.1,-15.891
  lines w0.1: -0.5,0 0.5,0 ; 0,-0.5 0,0.5
3D body "d4s20l-40mA5-Z.stp": height 10.95, standoff -3.2, extent -6,-15.791 6,11.509

## ROS-D4S20P-400A5-A_V [mm] "Dual HSD Right Angle Plug, Edge Mount, 28.25x24.7x8.1mm, Rosenberger Recommended"
height 8.1
pads (16):
  round 1.45 hole 0.95: 1_1(-7.35,7.81) 1_2(-7.35,5.81) 1_3(-5.35,5.81) 1_4(-5.35,7.81) 2_1(5.35,7.81) 2_2(5.35,5.81) 2_3(7.35,5.81) 2_4(7.35,7.81)
  round 2.25 hole 1.75: MH(-10.1,2.96) MH(-10.1,10.66) MH(-2.6,2.96) MH(-2.6,10.66) MH(2.6,2.96) MH(2.6,10.66) MH(10.1,2.96) MH(10.1,10.66)
Top Layer:
  region: -2.6,1.645 -2.705,1.645 -2.914,1.675 -3.116,1.733 -3.308,1.819 -3.486,1.931 -3.647,2.067 -3.787,2.224 -3.904,2.399 -3.95,2.494 -3.95,6.57 -3.903,6.575 -3.817,6.61 -3.75,6.677 -3.715,6.763 -3.71,6.81 -2.6,6.81 -2.6,3.835 -2.714,3.828 -2.935,3.768 -3.133,3.654 -3.294,3.493 -3.408,3.295 -3.468,3.074 -3.468,2.846 -3.408,2.625 -3.294,2.427 -3.133,2.266 -2.935,2.152 -2.714,2.092 -2.6,2.085
  region: -2.6,11.975 -2.705,11.975 -2.914,11.945 -3.116,11.887 -3.308,11.801 -3.486,11.689 -3.647,11.553 -3.787,11.396 -3.904,11.221 -3.95,11.126 -3.95,7.05 -3.903,7.045 -3.817,7.01 -3.75,6.943 -3.715,6.857 -3.71,6.81 -2.6,6.81 -2.6,9.785 -2.714,9.792 -2.935,9.852 -3.133,9.966 -3.294,10.127 -3.408,10.325 -3.468,10.546 -3.468,10.774 -3.408,10.995 -3.294,11.193 -3.133,11.354 -2.935,11.468 -2.714,11.528 -2.6,11.535
  region: -10.1,1.645 -9.995,1.645 -9.786,1.675 -9.584,1.733 -9.392,1.819 -9.214,1.931 -9.053,2.067 -8.913,2.224 -8.796,2.399 -8.75,2.494 -8.75,6.57 -8.797,6.575 -8.883,6.61 -8.95,6.677 -8.985,6.763 -8.99,6.81 -10.1,6.81 -10.1,3.835 -9.986,3.828 -9.765,3.768 -9.567,3.654 -9.406,3.493 -9.292,3.295 -9.232,3.074 -9.232,2.846 -9.292,2.625 -9.406,2.427 -9.567,2.266 -9.765,2.152 -9.986,2.092 -10.1,2.085
  region: -10.1,11.975 -9.995,11.975 -9.786,11.945 -9.584,11.887 -9.392,11.801 -9.214,11.689 -9.053,11.553 -8.913,11.396 -8.796,11.221 -8.75,11.126 -8.75,7.05 -8.797,7.045 -8.883,7.01 -8.95,6.943 -8.985,6.857 -8.99,6.81 -10.1,6.81 -10.1,9.785 -9.986,9.792 -9.765,9.852 -9.567,9.966 -9.406,10.127 -9.292,10.325 -9.232,10.546 -9.232,10.774 -9.292,10.995 -9.406,11.193 -9.567,11.354 -9.765,11.468 -9.986,11.528 -10.1,11.535
  region: 2.6,1.645 2.705,1.645 2.914,1.675 3.116,1.733 3.308,1.819 3.486,1.931 3.647,2.067 3.787,2.224 3.904,2.399 3.95,2.494 3.95,6.57 3.903,6.575 3.817,6.61 3.75,6.677 3.715,6.763 3.71,6.81 2.6,6.81 2.6,3.835 2.714,3.828 2.935,3.768 3.133,3.654 3.294,3.493 3.408,3.295 3.468,3.074 3.468,2.846 3.408,2.625 3.294,2.427 3.133,2.266 2.935,2.152 2.714,2.092 2.6,2.085
  region: 2.6,11.975 2.705,11.975 2.914,11.945 3.116,11.887 3.308,11.801 3.486,11.689 3.647,11.553 3.787,11.396 3.904,11.221 3.95,11.126 3.95,7.05 3.903,7.045 3.817,7.01 3.75,6.943 3.715,6.857 3.71,6.81 2.6,6.81 2.6,9.785 2.714,9.792 2.935,9.852 3.133,9.966 3.294,10.127 3.408,10.325 3.468,10.546 3.468,10.774 3.408,10.995 3.294,11.193 3.133,11.354 2.935,11.468 2.714,11.528 2.6,11.535
  region: 10.1,11.975 9.995,11.975 9.786,11.945 9.584,11.887 9.392,11.801 9.214,11.689 9.053,11.553 8.913,11.396 8.796,11.221 8.75,11.126 8.75,7.05 8.797,7.045 8.883,7.01 8.95,6.943 8.985,6.857 8.99,6.81 10.1,6.81 10.1,9.785 9.986,9.792 9.765,9.852 9.567,9.966 9.406,10.127 9.292,10.325 9.232,10.546 9.232,10.774 9.292,10.995 9.406,11.193 9.567,11.354 9.765,11.468 9.986,11.528 10.1,11.535
  region: 11.35,6.81 10.1,6.81 10.1,3.835 10.214,3.828 10.435,3.768 10.633,3.654 10.794,3.493 10.908,3.295 10.968,3.074 10.968,2.846 10.908,2.625 10.794,2.427 10.633,2.266 10.435,2.152 10.214,2.092 10.1,2.085 10.1,1.645 10.2,1.649 10.396,1.683 10.586,1.745 10.765,1.833 10.93,1.945 11.078,2.08 11.205,2.233 11.31,2.403 11.35,2.494
  region: 10.1,1.645 9.995,1.645 9.786,1.675 9.584,1.733 9.392,1.819 9.214,1.931 9.053,2.067 8.913,2.224 8.796,2.399 8.75,2.494 8.75,6.57 8.797,6.575 8.883,6.61 8.95,6.677 8.985,6.763 8.99,6.81 10.1,6.81 10.1,3.835 9.986,3.828 9.765,3.768 9.567,3.654 9.406,3.493 9.292,3.295 9.232,3.074 9.232,2.846 9.292,2.625 9.406,2.427 9.567,2.266 9.765,2.152 9.986,2.092 10.1,2.085
  region: 8.1,4.11 8.1,4.036 8.071,3.891 8.015,3.755 7.933,3.632 7.828,3.527 7.705,3.445 7.569,3.389 7.424,3.36 7.35,3.36 7.35,5.335 7.443,5.344 7.614,5.415 7.745,5.546 7.816,5.717 7.816,5.903 7.745,6.074 7.614,6.205 7.443,6.276 7.35,6.285 7.35,6.56 7.424,6.56 7.569,6.531 7.705,6.475 7.828,6.393 7.933,6.288 8.015,6.165 8.071,6.029 8.1,5.884 8.1,5.81
  region: 11.35,6.81 10.1,6.81 10.1,9.785 10.214,9.792 10.435,9.852 10.633,9.966 10.794,10.127 10.908,10.325 10.968,10.546 10.968,10.774 10.908,10.995 10.794,11.193 10.633,11.354 10.435,11.468 10.214,11.528 10.1,11.535 10.1,11.975 10.2,11.971 10.396,11.937 10.586,11.875 10.765,11.787 10.93,11.675 11.078,11.54 11.205,11.387 11.31,11.217 11.35,11.126
  region: 1.35,6.81 2.6,6.81 2.6,9.785 2.486,9.792 2.265,9.852 2.067,9.966 1.906,10.127 1.792,10.325 1.732,10.546 1.732,10.774 1.792,10.995 1.906,11.193 2.067,11.354 2.265,11.468 2.486,11.528 2.6,11.535 2.6,11.975 2.5,11.971 2.304,11.937 2.114,11.875 1.935,11.787 1.77,11.675 1.622,11.54 1.495,11.387 1.39,11.217 1.35,11.126
  region: 1.35,6.81 2.6,6.81 2.6,3.835 2.486,3.828 2.265,3.768 2.067,3.654 1.906,3.493 1.792,3.295 1.732,3.074 1.732,2.846 1.792,2.625 1.906,2.427 2.067,2.266 2.265,2.152 2.486,2.092 2.6,2.085 2.6,1.645 2.5,1.649 2.304,1.683 2.114,1.745 1.935,1.833 1.77,1.945 1.622,2.08 1.495,2.233 1.39,2.403 1.35,2.494
  region: 6.6,4.11 6.6,4.036 6.629,3.891 6.685,3.755 6.767,3.632 6.872,3.527 6.995,3.445 7.131,3.389 7.276,3.36 7.35,3.36 7.35,5.335 7.257,5.344 7.086,5.415 6.955,5.546 6.884,5.717 6.884,5.903 6.955,6.074 7.086,6.205 7.257,6.276 7.35,6.285 7.35,6.56 7.276,6.56 7.131,6.531 6.995,6.475 6.872,6.393 6.767,6.288 6.685,6.165 6.629,6.029 6.6,5.884 6.6,5.81
  region: 6.1,4.11 6.1,4.036 6.071,3.891 6.015,3.755 5.933,3.632 5.828,3.527 5.705,3.445 5.569,3.389 5.424,3.36 5.35,3.36 5.35,5.335 5.443,5.344 5.614,5.415 5.745,5.546 5.816,5.717 5.816,5.903 5.745,6.074 5.614,6.205 5.443,6.276 5.35,6.285 5.35,6.56 5.424,6.56 5.569,6.531 5.705,6.475 5.828,6.393 5.933,6.288 6.015,6.165 6.071,6.029 6.1,5.884 6.1,5.81
  region: 4.6,4.11 4.6,4.036 4.629,3.891 4.685,3.755 4.767,3.632 4.872,3.527 4.995,3.445 5.131,3.389 5.276,3.36 5.35,3.36 5.35,5.335 5.257,5.344 5.086,5.415 4.955,5.546 4.884,5.717 4.884,5.903 4.955,6.074 5.086,6.205 5.257,6.276 5.35,6.285 5.35,6.56 5.276,6.56 5.131,6.531 4.995,6.475 4.872,6.393 4.767,6.288 4.685,6.165 4.629,6.029 4.6,5.884 4.6,5.81
  region: 6.1,9.51 6.1,9.584 6.071,9.729 6.015,9.865 5.933,9.988 5.828,10.093 5.705,10.175 5.569,10.231 5.424,10.26 5.35,10.26 5.35,8.285 5.443,8.276 5.614,8.205 5.745,8.074 5.816,7.903 5.816,7.717 5.745,7.546 5.614,7.415 5.443,7.344 5.35,7.335 5.35,7.06 5.424,7.06 5.569,7.089 5.705,7.145 5.828,7.227 5.933,7.332 6.015,7.455 6.071,7.591 6.1,7.736 6.1,7.81
  region: 4.6,9.51 4.6,9.584 4.629,9.729 4.685,9.865 4.767,9.988 4.872,10.093 4.995,10.175 5.131,10.231 5.276,10.26 5.35,10.26 5.35,8.285 5.257,8.276 5.086,8.205 4.955,8.074 4.884,7.903 4.884,7.717 4.955,7.546 5.086,7.415 5.257,7.344 5.35,7.335 5.35,7.06 5.276,7.06 5.131,7.089 4.995,7.145 4.872,7.227 4.767,7.332 4.685,7.455 4.629,7.591 4.6,7.736 4.6,7.81
  region: 6.6,9.51 6.6,9.584 6.629,9.729 6.685,9.865 6.767,9.988 6.872,10.093 6.995,10.175 7.131,10.231 7.276,10.26 7.35,10.26 7.35,8.285 7.257,8.276 7.086,8.205 6.955,8.074 6.884,7.903 6.884,7.717 6.955,7.546 7.086,7.415 7.257,7.344 7.35,7.335 7.35,7.06 7.276,7.06 7.131,7.089 6.995,7.145 6.872,7.227 6.767,7.332 6.685,7.455 6.629,7.591 6.6,7.736 6.6,7.81
  region: 8.1,9.51 8.1,9.584 8.071,9.729 8.015,9.865 7.933,9.988 7.828,10.093 7.705,10.175 7.569,10.231 7.424,10.26 7.35,10.26 7.35,8.285 7.443,8.276 7.614,8.205 7.745,8.074 7.816,7.903 7.816,7.717 7.745,7.546 7.614,7.415 7.443,7.344 7.35,7.335 7.35,7.06 7.424,7.06 7.569,7.089 7.705,7.145 7.828,7.227 7.933,7.332 8.015,7.455 8.071,7.591 8.1,7.736 8.1,7.81
  region: -8.1,9.51 -8.1,9.584 -8.071,9.729 -8.015,9.865 -7.933,9.988 -7.828,10.093 -7.705,10.175 -7.569,10.231 -7.424,10.26 -7.35,10.26 -7.35,8.285 -7.443,8.276 -7.614,8.205 -7.745,8.074 -7.816,7.903 -7.816,7.717 -7.745,7.546 -7.614,7.415 -7.443,7.344 -7.35,7.335 -7.35,7.06 -7.424,7.06 -7.569,7.089 -7.705,7.145 -7.828,7.227 -7.933,7.332 -8.015,7.455 -8.071,7.591 -8.1,7.736 -8.1,7.81
  region: -6.6,9.51 -6.6,9.584 -6.629,9.729 -6.685,9.865 -6.767,9.988 -6.872,10.093 -6.995,10.175 -7.131,10.231 -7.276,10.26 -7.35,10.26 -7.35,8.285 -7.257,8.276 -7.086,8.205 -6.955,8.074 -6.884,7.903 -6.884,7.717 -6.955,7.546 -7.086,7.415 -7.257,7.344 -7.35,7.335 -7.35,7.06 -7.276,7.06 -7.131,7.089 -6.995,7.145 -6.872,7.227 -6.767,7.332 -6.685,7.455 -6.629,7.591 -6.6,7.736 -6.6,7.81
  region: -4.6,9.51 -4.6,9.584 -4.629,9.729 -4.685,9.865 -4.767,9.988 -4.872,10.093 -4.995,10.175 -5.131,10.231 -5.276,10.26 -5.35,10.26 -5.35,8.285 -5.257,8.276 -5.086,8.205 -4.955,8.074 -4.884,7.903 -4.884,7.717 -4.955,7.546 -5.086,7.415 -5.257,7.344 -5.35,7.335 -5.35,7.06 -5.276,7.06 -5.131,7.089 -4.995,7.145 -4.872,7.227 -4.767,7.332 -4.685,7.455 -4.629,7.591 -4.6,7.736 -4.6,7.81
  region: -6.1,9.51 -6.1,9.584 -6.071,9.729 -6.015,9.865 -5.933,9.988 -5.828,10.093 -5.705,10.175 -5.569,10.231 -5.424,10.26 -5.35,10.26 -5.35,8.285 -5.443,8.276 -5.614,8.205 -5.745,8.074 -5.816,7.903 -5.816,7.717 -5.745,7.546 -5.614,7.415 -5.443,7.344 -5.35,7.335 -5.35,7.06 -5.424,7.06 -5.569,7.089 -5.705,7.145 -5.828,7.227 -5.933,7.332 -6.015,7.455 -6.071,7.591 -6.1,7.736 -6.1,7.81
  region: -4.6,4.11 -4.6,4.036 -4.629,3.891 -4.685,3.755 -4.767,3.632 -4.872,3.527 -4.995,3.445 -5.131,3.389 -5.276,3.36 -5.35,3.36 -5.35,5.335 -5.257,5.344 -5.086,5.415 -4.955,5.546 -4.884,5.717 -4.884,5.903 -4.955,6.074 -5.086,6.205 -5.257,6.276 -5.35,6.285 -5.35,6.56 -5.276,6.56 -5.131,6.531 -4.995,6.475 -4.872,6.393 -4.767,6.288 -4.685,6.165 -4.629,6.029 -4.6,5.884 -4.6,5.81
  region: -6.1,4.11 -6.1,4.036 -6.071,3.891 -6.015,3.755 -5.933,3.632 -5.828,3.527 -5.705,3.445 -5.569,3.389 -5.424,3.36 -5.35,3.36 -5.35,5.335 -5.443,5.344 -5.614,5.415 -5.745,5.546 -5.816,5.717 -5.816,5.903 -5.745,6.074 -5.614,6.205 -5.443,6.276 -5.35,6.285 -5.35,6.56 -5.424,6.56 -5.569,6.531 -5.705,6.475 -5.828,6.393 -5.933,6.288 -6.015,6.165 -6.071,6.029 -6.1,5.884 -6.1,5.81
  region: -6.6,4.11 -6.6,4.036 -6.629,3.891 -6.685,3.755 -6.767,3.632 -6.872,3.527 -6.995,3.445 -7.131,3.389 -7.276,3.36 -7.35,3.36 -7.35,5.335 -7.257,5.344 -7.086,5.415 -6.955,5.546 -6.884,5.717 -6.884,5.903 -6.955,6.074 -7.086,6.205 -7.257,6.276 -7.35,6.285 -7.35,6.56 -7.276,6.56 -7.131,6.531 -6.995,6.475 -6.872,6.393 -6.767,6.288 -6.685,6.165 -6.629,6.029 -6.6,5.884 -6.6,5.81
  region: -1.35,6.81 -2.6,6.81 -2.6,3.835 -2.486,3.828 -2.265,3.768 -2.067,3.654 -1.906,3.493 -1.792,3.295 -1.732,3.074 -1.732,2.846 -1.792,2.625 -1.906,2.427 -2.067,2.266 -2.265,2.152 -2.486,2.092 -2.6,2.085 -2.6,1.645 -2.5,1.649 -2.304,1.683 -2.114,1.745 -1.935,1.833 -1.77,1.945 -1.622,2.08 -1.495,2.233 -1.39,2.403 -1.35,2.494
  region: -1.35,6.81 -2.6,6.81 -2.6,9.785 -2.486,9.792 -2.265,9.852 -2.067,9.966 -1.906,10.127 -1.792,10.325 -1.732,10.546 -1.732,10.774 -1.792,10.995 -1.906,11.193 -2.067,11.354 -2.265,11.468 -2.486,11.528 -2.6,11.535 -2.6,11.975 -2.5,11.971 -2.304,11.937 -2.114,11.875 -1.935,11.787 -1.77,11.675 -1.622,11.54 -1.495,11.387 -1.39,11.217 -1.35,11.126
  region: -11.35,6.81 -10.1,6.81 -10.1,9.785 -10.214,9.792 -10.435,9.852 -10.633,9.966 -10.794,10.127 -10.908,10.325 -10.968,10.546 -10.968,10.774 -10.908,10.995 -10.794,11.193 -10.633,11.354 -10.435,11.468 -10.214,11.528 -10.1,11.535 -10.1,11.975 -10.2,11.971 -10.396,11.937 -10.586,11.875 -10.765,11.787 -10.93,11.675 -11.078,11.54 -11.205,11.387 -11.31,11.217 -11.35,11.126
  region: -8.1,4.11 -8.1,4.036 -8.071,3.891 -8.015,3.755 -7.933,3.632 -7.828,3.527 -7.705,3.445 -7.569,3.389 -7.424,3.36 -7.35,3.36 -7.35,5.335 -7.443,5.344 -7.614,5.415 -7.745,5.546 -7.816,5.717 -7.816,5.903 -7.745,6.074 -7.614,6.205 -7.443,6.276 -7.35,6.285 -7.35,6.56 -7.424,6.56 -7.569,6.531 -7.705,6.475 -7.828,6.393 -7.933,6.288 -8.015,6.165 -8.071,6.029 -8.1,5.884 -8.1,5.81
  region: -11.35,6.81 -10.1,6.81 -10.1,3.835 -10.214,3.828 -10.435,3.768 -10.633,3.654 -10.794,3.493 -10.908,3.295 -10.968,3.074 -10.968,2.846 -10.908,2.625 -10.794,2.427 -10.633,2.266 -10.435,2.152 -10.214,2.092 -10.1,2.085 -10.1,1.645 -10.2,1.649 -10.396,1.683 -10.586,1.745 -10.765,1.833 -10.93,1.945 -11.078,2.08 -11.205,2.233 -11.31,2.403 -11.35,2.494
Top Overlay:
  lines w0.2: -11.85,7.343 -11.85,12.56 cw(c-11.65,12.56) -11.65,12.76 -10.85,12.76 10.85,12.76 11.65,12.76 cw(c11.65,12.56) 11.85,12.56 11.85,7.343 ; -10.85,1.426 -10.85,-0.24 ; 10.85,1.426 10.85,-0.24 ; -10.85,-0.24 cw(c-10.65,-0.24) -10.65,-0.04 10.65,-0.04 cw(c10.65,-0.24) 10.85,-0.24 ; -10.85,-0.24 -10.85,-0.59 ccw(c-10.65,-0.59) -10.65,-0.79 10.65,-0.79 ccw(c10.65,-0.59) 10.85,-0.59 10.85,-0.24
Top Paste:
  drawing of 16 lines, arcs and shapes, not listed
Keep-Out Layer:
  region: -0.7,10.66 -0.753,11.108 -0.911,11.531 -1.192,11.945 -1.208,11.989 -1.207,12.611 -1.187,12.66 -1.143,12.76 1.143,12.76 1.187,12.66 1.207,12.611 1.208,11.989 1.192,11.945 0.911,11.531 0.753,11.108 0.7,10.66 0.673,10.56 0.641,10.518 0.551,10.467 -0.551,10.467 -0.641,10.518 -0.673,10.56
  region: -10.85,0 -10.85,0.933 -10.75,1.106 -10.65,1.133 -10.598,1.126 -10.016,1.062 -9.442,1.178 -8.93,1.463 -8.837,1.503 -8.787,1.504 -8.737,1.493 -8.627,1.392 -8.274,0.849 -7.795,0.414 -7.643,0.315 -6.961,0.035 -6.961,-0.003
  region: 10.85,0 10.85,0.933 10.75,1.106 10.65,1.133 10.598,1.126 10.016,1.062 9.442,1.178 8.93,1.463 8.837,1.503 8.787,1.504 8.737,1.493 8.627,1.392 8.274,0.849 7.795,0.414 7.643,0.315 6.961,0.035 6.961,-0.003
Mechanical 3:
  lines w0.1: -12.1,0 11.9,0
  text "Board Edge" at -12.2,-0.5 h0.2
Mechanical 13:
  drawing of 192 lines, arcs and shapes, not listed
  text ".Designator" at -2.274,0.424 h2.69
Mechanical 15:
  lines w0.05: -12.45,-15.59 -12.45,12.86 12.45,12.86 12.45,-15.59 -12.45,-15.59
  lines w0.1: -0.5,0 0.5,0 ; 0,-0.5 0,0.5
3D body "d4s20p-400A5-A.stp": height 11, standoff -3.2, extent -12.35,-15.49 12.35,12.76